# Altium footprint library Miscellaneous.PcbLib: 74 footprints (part 4 of 5)
Each footprint in its own frame and in the unit in brackets; x right, y up, seen from the top. Pads: shape width x height; smd on the part's side, far side on the other; paste and mask are expansions set on the pad; w line width, h text height; cw(c..) or ccw(c..) is an arc to the next point about the centre after c.
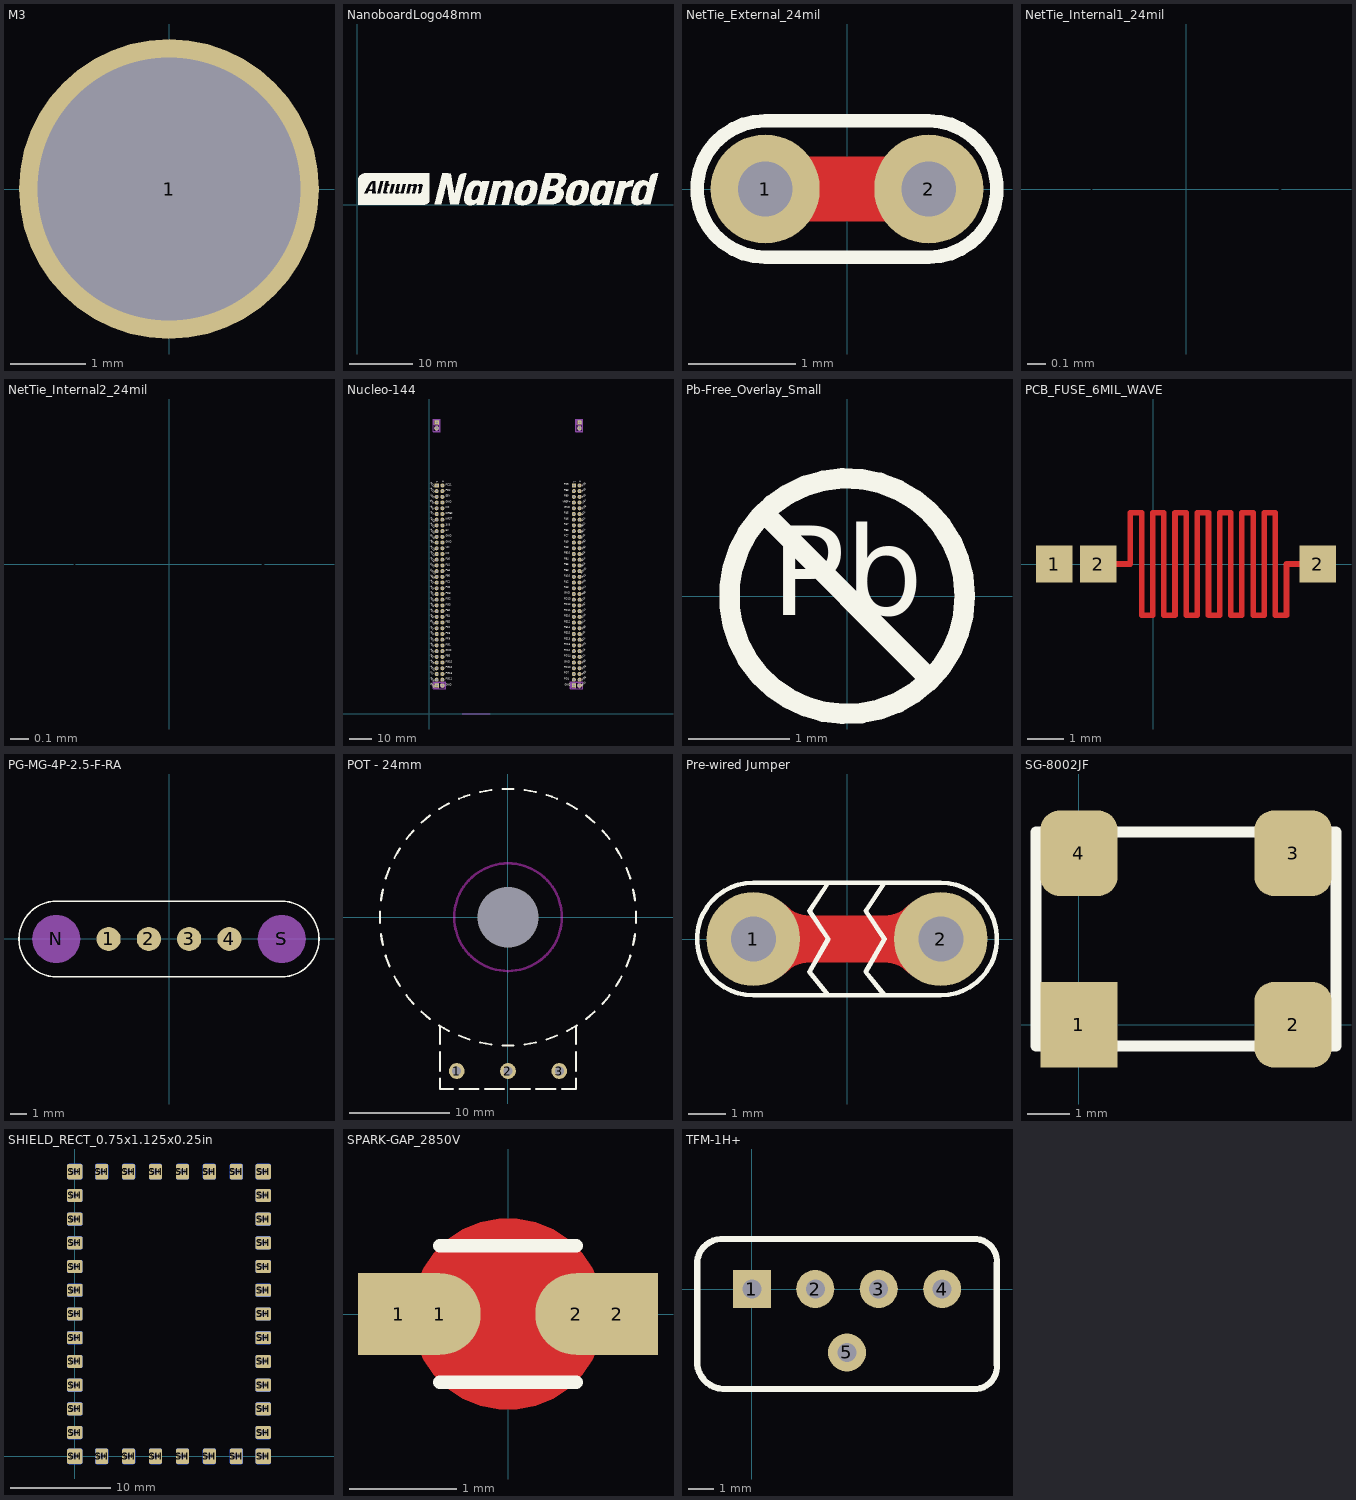
[diagram p3: the footprints below, top view; thin cyan lines are the x and y axes]

## M3 [mm]
pads (1):
  round 4 hole 3.5: 1(0,0)

## NanoboardLogo48mm [mil]
Top Overlay:
  drawing of 3446 lines, arcs and shapes, not listed

## NetTie_External_24mil [mil]
pads (2):
  round 40 hole 20: 1(-30,0) 2(30,0)
Top Layer:
  lines w24: -30,0 30,0
Top Overlay:
  lines w5: -30,-25 cw(c-30,0) -30,25 30,25 cw(c30,0) 30,-25 -30,-25
Top Solder:
  rectangle: -30,-18 30,18

## NetTie_Internal1_24mil [mil]
pads (2):
  round 24 on Mid1: 1(-20,0) 2(20,0)
Mid-Layer 1:
  lines w24: -20,0 20,0

## NetTie_Internal2_24mil [mil]
pads (2):
  round 24 on Mid2: 1(-20,0) 2(20,0)
Mid-Layer 2:
  lines w24: -20,0 20,0

## Nucleo-144 [mm]
pads (148):
  round 1.8 / inner round 1.6 / far side round 1.6 hole 1 mask+0.05: 3V3(5.842,83.82) 5V(5.842,81.28) AGND(66.802,63.5) BT0(3.302,93.98) E5V(5.842,96.52) GND(3.302,40.64) GND(3.302,78.74) GND(3.302,127) GND(5.842,12.7) GND(5.842,27.94) GND(5.842,76.2) GND(5.842,78.74) GND(5.842,93.98) GND(64.262,22.86) GND(64.262,53.34) GND(64.262,91.44) GND(66.802,12.7) GND(66.802,35.56) GND(66.802,78.74) GND(66.802,127) IOREF(5.842,88.9) NC(3.302,17.78) NC(5.842,71.12) NC(5.842,91.44) NRST(5.842,86.36) OSCI(3.302,66.04) OSCO(3.302,63.5) PA0(5.842,68.58) PA1(5.842,66.04) PA2(64.262,58.42) PA3(64.262,55.88) PA4(5.842,63.5) PA5(64.262,88.9) PA6(64.262,86.36) PA7(64.262,83.82) PA8(64.262,73.66) PA9(64.262,76.2) PA10(64.262,60.96) PA11(66.802,86.36) PA12(66.802,88.9) PA13(3.302,86.36) PA14(3.302,83.82) PA15(3.302,81.28) PB0(5.842,60.96) PB1(66.802,73.66) PB2(66.802,76.2) PB3(64.262,63.5) PB4(64.262,68.58) PB5(64.262,66.04) PB6(64.262,81.28) PB7(3.302,76.2) PB8(64.262,99.06) PB9(64.262,96.52) PB10(64.262,71.12) PB11(66.802,81.28) PB12(66.802,83.82) PB13(66.802,66.04) PB14(66.802,68.58) PB15(66.802,71.12) PC0(5.842,55.88) PC1(5.842,58.42) PC2(3.302,58.42) PC3(3.302,55.88) PC4(66.802,60.96) PC5(66.802,96.52) PC6(66.802,99.06) PC7(64.262,78.74) PC8(66.802,101.6) PC11(5.842,101.6) PC12(3.302,99.06) PC13(3.302,73.66) PC14(3.302,71.12) PC15(3.302,68.58) PD0(3.302,30.48) PD1(3.302,33.02) PD2(5.842,99.06) PD3(5.842,53.34) PD4(3.302,53.34) PD5(3.302,50.8) PD6(3.302,48.26) PD7(3.302,45.72) PD8(66.802,91.44) PD9(3.302,15.24) PD10(64.262,20.32) PD11(64.262,45.72) PD12(64.262,48.26) PD13(64.262,50.8) PD14(66.802,45.72) PD15(66.802,43.18) PE0(66.802,22.86) PE1(3.302,25.4) PE2(5.842,45.72) PE3(3.302,43.18) PE4(5.842,43.18) PE5(5.842,40.64) PE6(5.842,25.4) PE7(66.802,48.26) PE8(66.802,53.34) PE9(66.802,38.1) PE10(64.262,43.18) PE11(66.802,33.02) PE12(64.262,40.64) PE13(64.262,33.02) PE14(64.262,38.1) PE15(64.262,35.56) PF0(3.302,35.56) PF1(3.302,38.1) PF2(5.842,38.1) PF3(66.802,30.48) PF4(66.802,55.88) PF5(66.802,58.42) PF6(3.302,91.44) PF7(3.302,88.9) PF8(5.842,35.56) PF9(5.842,33.02) PF10(66.802,50.8) PF11(66.802,25.4) PF12(64.262,27.94) PF13(64.262,30.48) PF14(66.802,40.64) PF15(66.802,27.94) PG0(3.302,27.94) PG1(5.842,30.48) PG2(5.842,50.8) PG3(5.842,48.26) PG4(64.262,15.24) PG5(66.802,17.78) PG6(66.802,15.24) PG7(64.262,17.78) PG8(66.802,20.32) PG9(3.302,22.86) PG10(5.842,20.32) PG11(5.842,15.24) PG12(3.302,20.32) PG13(5.842,17.78) PG14(64.262,25.4) PG15(5.842,22.86) U5V(66.802,93.98) VBAT(3.302,60.96) VDD(3.302,96.52) VIN(5.842,73.66) VREF+(64.262,93.98)
  rect 1.85x1.85 hole 1 mask+0.05: GND(3.302,12.7)
  rect 1.85x1.85 / inner round 1.85 / far side rect 1.85x1.85 hole 1 mask+0.05: GND(3.302,129.54) GND(64.262,12.7) GND(66.802,129.54) PC9(64.262,101.6) PC10(3.302,101.6)
Top Overlay:
  text "2" at 5.266,103.664 h1.5
  text "1" at 2.741,103.389 h1.5
  text "2" at 66.226,103.639 h1.5
  text "1" at 63.701,103.364 h1.5
  text "PD3" at 7.366,52.832 h1.2
  text "NRST" at 7.366,85.852 h1.2
  text "IOREF" at 7.366,88.392 h1.2
  text "PC11" at 7.366,101.092 h1.2
  text "PB0" at 7.366,60.452 h1.2
  text "PC0" at 7.366,55.372 h1.2
  text "PC1" at 7.366,57.912 h1.2
  text "PG2" at 7.366,50.292 h1.2
  text "PE5" at 7.366,40.132 h1.2
  text "PF2" at 7.366,37.592 h1.2
  text "PG3" at 7.366,47.752 h1.2
  text "PE4" at 7.366,42.672 h1.2
  text "PG13" at 7.366,17.272 h1.2
  text "PG11" at 7.366,14.732 h1.2
  text "PE2" at 7.366,45.212 h1.2
  text "GND" at 7.366,27.432 h1.2
  text "PE6" at 7.366,24.892 h1.2
  text "PG1" at 7.366,29.972 h1.2
  text "PF9" at 7.366,32.512 h1.2
  text "PG15" at 7.366,22.352 h1.2
  text "PG10" at 7.366,19.812 h1.2
  text "PF8" at 7.366,35.052 h1.2
  text "PA4" at 7.366,62.992 h1.2
  text "PA1" at 7.366,65.532 h1.2
  text "PA0" at 7.366,68.072 h1.2
  text "NC" at 7.366,70.612 h1.2
  text "VIN" at 7.366,73.152 h1.2
  text "GND" at 7.366,75.692 h1.2
  text "GND" at 7.366,78.232 h1.2
  text "5V" at 7.366,80.772 h1.2
  text "3V3" at 7.366,83.312 h1.2
  text "NC" at 7.366,90.932 h1.2
  text "GND" at 7.366,93.472 h1.2
  text "E5V" at 7.366,96.012 h1.2
  text "PD2" at 7.366,98.552 h1.2
  text "PC15" at 0,68.834 h1.2
  text "PF7" at 0,89.154 h1.2
  text "PA13" at 0,86.614 h1.2
  text "PC10" at 0,102.108 h1.2
  text "PC12" at 0,99.568 h1.2
  text "PA14" at 0,84.074 h1.2
  text "PA15" at 0,81.534 h1.2
  text "GND" at 0,78.994 h1.2
  text "VDD" at 0,97.028 h1.2
  text "BT0" at 0,94.234 h1.2
  text "PF6" at 0,91.694 h1.2
  text "PD0" at 0,30.734 h1.2
  text "PD5" at 0,51.054 h1.2
  text "PD6" at 0,48.514 h1.2
  text "PD7" at 0,45.974 h1.2
  text "PE3" at 0,43.434 h1.2
  text "GND" at 0,40.894 h1.2
  text "OSCO" at 0,63.754 h1.2
  text "VBAT" at 0,61.214 h1.2
  text "PC2" at 0,58.674 h1.2
  text "PD4" at 0,53.594 h1.2
  text "PB7" at 0,76.454 h1.2
  text "PC13" at 0,73.914 h1.2
  text "PC14" at 0,71.374 h1.2
  text "OSCI" at 0,66.294 h1.2
  text "PF1" at 0,38.1 h1.2
  text "PF0" at 0,35.814 h1.2
  text "PD9" at 0,15.494 h1.2
  text "PG12" at 0,20.574 h1.2
  text "PG9" at 0,23.114 h1.2
  text "PE1" at 0,25.654 h1.2
  text "PD1" at 0,33.274 h1.2
  text "PC3" at 0,56.134 h1.2
  text "PG0" at 0,28.194 h1.2
  text "NC" at 0,18.034 h1.2
  text "PB8" at 60.106,98.635 h1.2
  text "PB9" at 60.106,96.095 h1.2
  text "PA6" at 60.106,85.935 h1.2
  text "PG4" at 60.106,14.815 h1.2
  text "PF12" at 60.106,27.515 h1.2
  text "PF13" at 60.106,30.055 h1.2
  text "PG7" at 60.106,17.355 h1.2
  text "GND" at 60.106,22.435 h1.2
  text "PG14" at 60.106,24.975 h1.2
  text "PE14" at 60.106,37.675 h1.2
  text "PE15" at 60.106,35.135 h1.2
  text "PE13" at 60.106,32.595 h1.2
  text "PD11" at 60.106,45.295 h1.2
  text "PE10" at 60.106,42.755 h1.2
  text "PE12" at 60.106,40.215 h1.2
  text "PD10" at 60.106,19.895 h1.2
  text "PD13" at 60.106,50.375 h1.2
  text "PD12" at 60.106,47.835 h1.2
  text "PA10" at 60.106,60.535 h1.2
  text "PA9" at 60.106,75.775 h1.2
  text "PA8" at 60.106,73.235 h1.2
  text "PB10" at 60.106,70.695 h1.2
  text "PB4" at 60.106,68.155 h1.2
  text "PB5" at 60.106,65.615 h1.2
  text "GND" at 60.106,52.915 h1.2
  text "PB3" at 60.106,63.075 h1.2
  text "PA2" at 60.106,57.995 h1.2
  text "PA3" at 60.106,55.455 h1.2
  text "PB6" at 60.106,80.855 h1.2
  text "PC7" at 60.106,78.315 h1.2
  text "PA7" at 60.106,83.395 h1.2
  text "GND" at 60.106,91.015 h1.2
  text "PA5" at 60.106,88.475 h1.2
  text "PC9" at 60.106,101.175 h1.2
  text "VREF+" at 59.411,93.548 h1.2
  text "PB12" at 68.072,82.296 h1.2
  text "PA11" at 68.072,84.836 h1.2
  text "PD8" at 68.58,90.424 h1.2
  text "U5V" at 68.58,92.964 h1.2
  text "PC5" at 68.58,95.504 h1.2
  text "PC6" at 68.58,98.044 h1.2
  text "PC8" at 68.58,100.584 h1.2
  text "PA12" at 68.072,87.376 h1.2
  text "PB1" at 68.58,72.644 h1.2
  text "PB15" at 68.072,69.596 h1.2
  text "PD14" at 68.072,44.196 h1.2
  text "PB14" at 68.072,67.056 h1.2
  text "PB13" at 68.072,64.516 h1.2
  text "AGND" at 68.072,61.976 h1.2
  text "PC4" at 68.58,59.944 h1.2
  text "PB2" at 68.58,75.184 h1.2
  text "GND" at 68.072,77.216 h1.2
  text "PB11" at 68.072,79.756 h1.2
  text "PF5" at 68.58,57.404 h1.2
  text "PF4" at 68.58,54.864 h1.2
  text "PG6" at 68.58,14.224 h1.2
  text "PF14" at 68.072,39.116 h1.2
  text "PF15" at 68.072,26.416 h1.2
  text "PF11" at 68.072,23.876 h1.2
  text "PE0" at 68.58,21.844 h1.2
  text "PG8" at 68.58,19.304 h1.2
  text "PD15" at 68.072,41.656 h1.2
  text "PE9" at 68.58,37.084 h1.2
  text "GND" at 68.072,34.036 h1.2
  text "PE11" at 68.072,31.496 h1.2
  text "PE8" at 68.58,52.324 h1.2
  text "PF10" at 68.072,49.276 h1.2
  text "PE7" at 68.58,47.244 h1.2
  text "PF3" at 68.58,29.464 h1.2
  text "PG5" at 68.58,16.764 h1.2
  text "GND" at 7.366,12.192 h1.2
  text "GND" at 60.198,12.192 h1.2
  text "GND" at 68.326,11.684 h1.2
  text "GND" at 0.009,12.954 h1.2
Bottom Overlay:
  lines w0.1: 37.369,-0.004 37.373,0 51.369,0 68,0 ; 37.369,0 2,0 cw(c2,2) 0,2 0,131.34 cw(c2,131.34) 2,133.34 68,133.34 cw(c68,131.34) 70,131.34 70,2 cw(c68,2) 68,0 ; 68,0 68,0
  lines w0.12: 2.032,13.97 7.112,13.97 ; 2.032,13.97 2.032,102.87 7.112,102.87 7.112,13.97 ; 2.032,13.97 7.112,13.97 ; 2.032,13.97 2.032,11.43 7.112,11.43 7.112,13.97 ; 62.992,13.97 62.992,102.87 68.072,102.87 68.072,13.97 ; 62.992,13.97 68.072,13.97 ; 62.992,13.97 62.992,11.43 68.072,11.43 68.072,13.97 ; 62.992,13.97 68.072,13.97 ; 2.032,125.73 4.572,125.73 4.572,130.81 2.032,130.81 2.032,125.73 ; 65.532,125.73 68.072,125.73 68.072,130.81 65.532,130.81 65.532,125.73
  lines w0.2: 36.139,0 52.589,0 52.589,11.45 36.139,11.45 36.139,0
  text "CN11" at 6.265,103.098 h1.5
  text "PF6" at 1.564,90.215 h1.2
  text "PG5" at 69.75,18.155 h1.2
  text "GND" at 5.975,10.075 h1.5
  text "GND" at 67,10.075 h1.5
  text "PG4" at 63.084,14.815 h1.2
  text "PF12" at 63.084,27.515 h1.2
  text "PF13" at 63.084,30.055 h1.2
  text "PF3" at 69.75,30.855 h1.2
  text "PF4" at 69.759,56.255 h1.2
  text "PF5" at 69.75,58.795 h1.2
  text "NC" at 1.27,17.018 h1.2
  text "PG15" at 9.535,22.435 h1.2
  text "PG0" at 1.689,26.765 h1.2
  text "PG1" at 8.784,30.055 h1.2
  text "PF0" at 1.562,34.385 h1.2
  text "PF1" at 1.449,36.925 h1.2
  text "PF2" at 8.746,37.675 h1.2
  text "PG3" at 8.933,47.835 h1.2
  text "PG2" at 8.925,50.375 h1.2
  text "NC" at 8.342,70.695 h1.2
  text "OSCI" at 2.015,64.54 h1.2
  text "PC8" at 69.75,101.975 h1.2
  text "PC6" at 69.75,99.435 h1.2
  text "PC5" at 69.75,96.895 h1.2
  text "U5V" at 69.75,94.355 h1.2
  text "PD8" at 69.75,91.815 h1.2
  text "PA11" at 69.759,86.735 h1.2
  text "PB12" at 69.759,84.195 h1.2
  text "PB11" at 69.759,81.655 h1.2
  text "GND" at 69.75,79.115 h1.2
  text "PB2" at 69.759,76.575 h1.2
  text "PC4" at 69.75,61.335 h1.2
  text "AGND" at 69.75,63.875 h1.2
  text "PB13" at 69.75,66.415 h1.2
  text "PB14" at 69.759,68.955 h1.2
  text "PB1" at 69.759,74.035 h1.2
  text "PD14" at 69.759,46.095 h1.2
  text "PE7" at 69.759,48.635 h1.2
  text "PF10" at 69.75,51.175 h1.2
  text "PE8" at 69.75,53.715 h1.2
  text "PB15" at 69.75,71.495 h1.2
  text "PE11" at 69.759,33.395 h1.2
  text "GND" at 69.75,35.935 h1.2
  text "PE9" at 69.75,38.475 h1.2
  text "PD15" at 69.75,43.555 h1.2
  text "PG6" at 69.75,15.615 h1.2
  text "PG8" at 69.75,20.695 h1.2
  text "PE0" at 69.75,23.235 h1.2
  text "PF11" at 69.759,25.775 h1.2
  text "PF15" at 69.75,28.315 h1.2
  text "PF14" at 69.759,41.015 h1.2
  text "PG7" at 63.084,17.355 h1.2
  text "PD10" at 63.084,19.895 h1.2
  text "GND" at 63.084,22.435 h1.2
  text "PG14" at 63.084,24.975 h1.2
  text "PE14" at 63.084,37.675 h1.2
  text "PE15" at 63.084,35.135 h1.2
  text "PE13" at 63.084,32.595 h1.2
  text "PD13" at 63.084,50.375 h1.2
  text "PD12" at 63.084,47.835 h1.2
  text "PD11" at 63.084,45.295 h1.2
  text "PE10" at 63.084,42.755 h1.2
  text "PE12" at 63.084,40.215 h1.2
  text "PB3" at 63.084,63.075 h1.2
  text "PA10" at 63.084,60.535 h1.2
  text "PA2" at 63.084,57.995 h1.2
  text "PA3" at 63.084,55.455 h1.2
  text "GND" at 63.084,52.915 h1.2
  text "PA9" at 63.084,75.775 h1.2
  text "PA8" at 63.084,73.235 h1.2
  text "PB10" at 63.084,70.695 h1.2
  text "PB4" at 63.084,68.155 h1.2
  text "PB5" at 63.084,65.615 h1.2
  text "PA5" at 63.084,88.475 h1.2
  text "PA6" at 63.084,85.935 h1.2
  text "PA7" at 63.084,83.395 h1.2
  text "PB6" at 63.084,80.855 h1.2
  text "PC7" at 63.084,78.315 h1.2
  text "PC9" at 63.084,101.175 h1.2
  text "PB8" at 63.084,98.635 h1.2
  text "PB9" at 63.084,96.095 h1.2
  text "GND" at 63.084,91.015 h1.2
  text "BT0" at 1.565,92.73 h1.2
  text "VDD" at 1.778,95.25 h1.2
  text "PC12" at 2.065,97.635 h1.2
  text "GND" at 1.871,77.34 h1.2
  text "PA15" at 2.032,79.78 h1.2
  text "PA14" at 2.017,82.345 h1.2
  text "PA13" at 2.028,84.885 h1.2
  text "PF7" at 1.554,87.7 h1.2
  text "PC15" at 2.074,67.055 h1.2
  text "PC14" at 2.068,69.595 h1.2
  text "PC13" at 2.07,72.16 h1.2
  text "PB7" at 1.597,74.95 h1.2
  text "PD4" at 1.636,52.09 h1.2
  text "PC3" at 1.648,54.605 h1.2
  text "PC2" at 1.642,57.12 h1.2
  text "VBAT" at 2.219,59.26 h1.2
  text "OSCO" at 2.429,61.7 h1.2
  text "GND" at 1.871,39.215 h1.2
  text "PE3" at 1.606,41.93 h1.2
  text "PD7" at 1.638,44.47 h1.2
  text "PD6" at 1.648,47.01 h1.2
  text "PD5" at 1.652,49.5 h1.2
  text "PD0" at 1.646,29.305 h1.2
  text "PD1" at 1.533,31.845 h1.2
  text "PE1" at 1.524,24.384 h1.2
  text "PG9" at 1.691,21.685 h1.2
  text "PG12" at 2.107,18.745 h1.2
  text "PD9" at 1.649,14.215 h1.2
  text "PE5" at 8.819,40.215 h1.2
  text "GND" at 9.188,27.515 h1.2
  text "PE6" at 8.814,24.975 h1.2
  text "PG10" at 9.528,19.895 h1.2
  text "PG13" at 9.53,17.355 h1.2
  text "PG11" at 9.381,14.815 h1.2
  text "PE4" at 8.811,42.755 h1.2
  text "PF8" at 8.755,35.135 h1.2
  text "PF9" at 8.755,32.595 h1.2
  text "PC1" at 8.724,57.995 h1.2
  text "PC0" at 8.871,55.455 h1.2
  text "PD3" at 8.873,52.915 h1.2
  text "VIN" at 8.614,73.235 h1.2
  text "PA0" at 8.812,68.155 h1.2
  text "PA1" at 8.665,65.615 h1.2
  text "PA4" at 8.811,63.075 h1.2
  text "PB0" at 8.812,60.535 h1.2
  text "GND" at 9.188,75.775 h1.2
  text "GND" at 9.188,78.315 h1.2
  text "5V" at 8.24,80.855 h1.2
  text "3V3" at 8.733,83.395 h1.2
  text "NRST" at 9.709,85.935 h1.2
  text "IOREF" at 9.872,88.475 h1.2
  text "GND" at 9.188,93.555 h1.2
  text "E5V" at 8.853,96.095 h1.2
  text "PD2" at 8.865,98.635 h1.2
  text "PC11" at 9.321,101.175 h1.2
  text "PA12" at 69.759,89.275 h1.2
  text "NC" at 8.342,91.015 h1.2
  text "CN12" at 65.375,103.175 h1.5
  text "PE2" at 8.806,45.295 h1.2
  text "PC10" at 2.032,100.076 h1.2
  text "VREF+" at 63.082,93.564 h1.2
  text "GND" at 0.762,126.746 h1.5
Mechanical 7:
  lines w0.01: 14.573,0.014 27.073,0.014
Mechanical 15:
  circle w0.01: c66.746,126.999 r0.925
  circle w0.01: c3.246,126.999 r0.925
  circle w0.01: c66.746,12.674 r0.925
  circle w0.01: c5.786,12.699 r0.925
  lines w0.01: 1.876,11.329 7.156,11.329 7.156,14.069 1.876,14.069 1.876,11.329 ; 1.876,125.629 4.616,125.629 4.616,130.909 1.876,130.909 1.876,125.629 ; 2.321,11.774 2.321,13.624 4.171,13.624 4.171,11.774 2.321,11.774 ; 2.321,128.614 2.321,130.464 4.171,130.464 4.171,128.614 2.321,128.614 ; 62.836,11.304 68.116,11.304 68.116,14.044 62.836,14.044 62.836,11.304 ; 63.281,11.749 63.281,13.599 65.131,13.599 65.131,11.749 63.281,11.749 ; 65.376,125.629 68.116,125.629 68.116,130.909 65.376,130.909 65.376,125.629 ; 65.821,128.614 65.821,130.464 67.671,130.464 67.671,128.614 65.821,128.614
  text "1" at 67.271,129.794 h1.5
  text "'.Designator'" at 68.875,130.8 h0.75
  text "1" at 3.771,129.794 h1.5
  text "'.Designator'" at 5.4,130.775 h0.75
  text "1" at 63.951,13.199 h1.5
  text "'.Designator'" at 67.425,13.9 h0.75
  text "1" at 2.991,13.224 h1.5
  text "'.Designator'" at 6.725,14.1 h0.75
Mechanical 17:
  lines w0.01: 1.696,11.149 7.336,11.149 7.336,14.249 1.696,14.249 1.696,11.149 ; 1.696,125.449 4.796,125.449 4.796,131.089 1.696,131.089 1.696,125.449 ; 62.656,11.124 68.296,11.124 68.296,14.224 62.656,14.224 62.656,11.124 ; 65.196,125.449 68.296,125.449 68.296,131.089 65.196,131.089 65.196,125.449
3D body "TSW-135-07-G-D.stp": height -3.12, standoff -14.04, extent 2.032,13.97 7.112,102.87
3D body "TSW-135-07-G-D.stp": height -3.12, standoff -14.04, extent 62.992,13.97 68.072,102.87
3D body "MB1364.step": height -2.94, standoff -21.51, extent 0,-4.1 70,134.458
3D body "PBD-2.stp": height 8.5, standoff -3.15, extent 2.032,125.73 4.572,130.81
3D body "PBD-2.stp": height 8.5, standoff -3.15, extent 65.532,125.73 68.072,130.81
3D body "PBD-2.stp": height 8.5, standoff -3.15, extent 62.992,59.69 68.072,62.23
3D body "PBD-2.stp": height 8.5, standoff -3.15, extent 62.992,62.23 68.072,64.77
3D body "PBD-2.stp": height 8.5, standoff -3.15, extent 62.992,57.15 68.072,59.69
3D body "PBD-2.stp": height 8.5, standoff -3.15, extent 62.992,67.31 68.072,69.85
3D body "PBD-2.stp": height 8.5, standoff -3.15, extent 62.992,69.85 68.072,72.39
3D body "PBD-2.stp": height 8.5, standoff -3.15, extent 62.992,64.77 68.072,67.31
3D body "PBD-2.stp": height 8.5, standoff -3.15, extent 62.992,74.93 68.072,77.47
3D body "PBD-2.stp": height 8.5, standoff -3.15, extent 62.992,77.47 68.072,80.01
3D body "PBD-2.stp": height 8.5, standoff -3.15, extent 62.992,72.39 68.072,74.93
3D body "PBD-2.stp": height 8.5, standoff -3.15, extent 62.992,82.55 68.072,85.09
3D body "PBD-2.stp": height 8.5, standoff -3.15, extent 62.992,85.09 68.072,87.63
3D body "PBD-2.stp": height 8.5, standoff -3.15, extent 62.992,80.01 68.072,82.55
3D body "PBD-2.stp": height 8.5, standoff -3.15, extent 62.992,90.17 68.072,92.71
3D body "PBD-2.stp": height 8.5, standoff -3.15, extent 62.992,92.71 68.072,95.25
3D body "PBD-2.stp": height 8.5, standoff -3.15, extent 62.992,87.63 68.072,90.17
3D body "PBD-2.stp": height 8.5, standoff -3.15, extent 62.992,97.79 68.072,100.33
3D body "PBD-2.stp": height 8.5, standoff -3.15, extent 62.992,100.33 68.072,102.87
3D body "PBD-2.stp": height 8.5, standoff -3.15, extent 62.992,95.25 68.072,97.79
3D body "PBD-2.stp": height 8.5, standoff -3.15, extent 62.992,13.97 68.072,16.51
3D body "PBD-2.stp": height 8.5, standoff -3.15, extent 62.992,16.51 68.072,19.05
3D body "PBD-2.stp": height 8.5, standoff -3.15, extent 62.992,11.43 68.072,13.97
3D body "PBD-2.stp": height 8.5, standoff -3.15, extent 62.992,21.59 68.072,24.13
3D body "PBD-2.stp": height 8.5, standoff -3.15, extent 62.992,24.13 68.072,26.67
3D body "PBD-2.stp": height 8.5, standoff -3.15, extent 62.992,19.05 68.072,21.59
3D body "PBD-2.stp": height 8.5, standoff -3.15, extent 62.992,29.21 68.072,31.75
3D body "PBD-2.stp": height 8.5, standoff -3.15, extent 62.992,31.75 68.072,34.29
3D body "PBD-2.stp": height 8.5, standoff -3.15, extent 62.992,26.67 68.072,29.21
3D body "PBD-2.stp": height 8.5, standoff -3.15, extent 62.992,36.83 68.072,39.37
3D body "PBD-2.stp": height 8.5, standoff -3.15, extent 62.992,39.37 68.072,41.91
3D body "PBD-2.stp": height 8.5, standoff -3.15, extent 62.992,34.29 68.072,36.83
3D body "PBD-2.stp": height 8.5, standoff -3.15, extent 62.992,44.45 68.072,46.99
3D body "PBD-2.stp": height 8.5, standoff -3.15, extent 62.992,46.99 68.072,49.53
3D body "PBD-2.stp": height 8.5, standoff -3.15, extent 62.992,41.91 68.072,44.45
3D body "PBD-2.stp": height 8.5, standoff -3.15, extent 62.992,52.07 68.072,54.61
3D body "PBD-2.stp": height 8.5, standoff -3.15, extent 62.992,54.61 68.072,57.15
3D body "PBD-2.stp": height 8.5, standoff -3.15, extent 62.992,49.53 68.072,52.07
3D body "PBD-2.stp": height 8.5, standoff -3.15, extent 2.032,59.69 7.112,62.23
3D body "PBD-2.stp": height 8.5, standoff -3.15, extent 2.032,62.23 7.112,64.77
3D body "PBD-2.stp": height 8.5, standoff -3.15, extent 2.032,57.15 7.112,59.69
3D body "PBD-2.stp": height 8.5, standoff -3.15, extent 2.032,67.31 7.112,69.85
3D body "PBD-2.stp": height 8.5, standoff -3.15, extent 2.032,69.85 7.112,72.39
3D body "PBD-2.stp": height 8.5, standoff -3.15, extent 2.032,64.77 7.112,67.31
3D body "PBD-2.stp": height 8.5, standoff -3.15, extent 2.032,74.93 7.112,77.47
3D body "PBD-2.stp": height 8.5, standoff -3.15, extent 2.032,77.47 7.112,80.01
3D body "PBD-2.stp": height 8.5, standoff -3.15, extent 2.032,72.39 7.112,74.93
3D body "PBD-2.stp": height 8.5, standoff -3.15, extent 2.032,82.55 7.112,85.09
3D body "PBD-2.stp": height 8.5, standoff -3.15, extent 2.032,85.09 7.112,87.63
3D body "PBD-2.stp": height 8.5, standoff -3.15, extent 2.032,80.01 7.112,82.55
3D body "PBD-2.stp": height 8.5, standoff -3.15, extent 2.032,90.17 7.112,92.71
3D body "PBD-2.stp": height 8.5, standoff -3.15, extent 2.032,92.71 7.112,95.25
3D body "PBD-2.stp": height 8.5, standoff -3.15, extent 2.032,87.63 7.112,90.17
3D body "PBD-2.stp": height 8.5, standoff -3.15, extent 2.032,97.79 7.112,100.33
3D body "PBD-2.stp": height 8.5, standoff -3.15, extent 2.032,100.33 7.112,102.87
3D body "PBD-2.stp": height 8.5, standoff -3.15, extent 2.032,95.25 7.112,97.79
3D body "PBD-2.stp": height 8.5, standoff -3.15, extent 2.032,13.97 7.112,16.51
3D body "PBD-2.stp": height 8.5, standoff -3.15, extent 2.032,16.51 7.112,19.05
3D body "PBD-2.stp": height 8.5, standoff -3.15, extent 2.032,11.43 7.112,13.97
3D body "PBD-2.stp": height 8.5, standoff -3.15, extent 2.032,21.59 7.112,24.13
3D body "PBD-2.stp": height 8.5, standoff -3.15, extent 2.032,24.13 7.112,26.67
3D body "PBD-2.stp": height 8.5, standoff -3.15, extent 2.032,19.05 7.112,21.59
3D body "PBD-2.stp": height 8.5, standoff -3.15, extent 2.032,29.21 7.112,31.75
3D body "PBD-2.stp": height 8.5, standoff -3.15, extent 2.032,31.75 7.112,34.29
3D body "PBD-2.stp": height 8.5, standoff -3.15, extent 2.032,26.67 7.112,29.21
3D body "PBD-2.stp": height 8.5, standoff -3.15, extent 2.032,36.83 7.112,39.37
3D body "PBD-2.stp": height 8.5, standoff -3.15, extent 2.032,39.37 7.112,41.91
3D body "PBD-2.stp": height 8.5, standoff -3.15, extent 2.032,34.29 7.112,36.83
3D body "PBD-2.stp": height 8.5, standoff -3.15, extent 2.032,44.45 7.112,46.99
3D body "PBD-2.stp": height 8.5, standoff -3.15, extent 2.032,46.99 7.112,49.53
3D body "PBD-2.stp": height 8.5, standoff -3.15, extent 2.032,41.91 7.112,44.45
3D body "PBD-2.stp": height 8.5, standoff -3.15, extent 2.032,52.07 7.112,54.61
3D body "PBD-2.stp": height 8.5, standoff -3.15, extent 2.032,54.61 7.112,57.15
3D body "PBD-2.stp": height 8.5, standoff -3.15, extent 2.032,49.53 7.112,52.07

## Pb-Free_Overlay_Small [mil]
height 161.42
Top Overlay:
  circle w8: c0,0 r46
  lines w8: -32.53,32.53 32.53,-32.53
  text "Pb" at -29.6,-18.9 h60

## PCB_FUSE_6MIL_WAVE [mm] "PCB Fuse, 6 mils wide, fuse time depends on substrate and current"
pads (3):
  rrect1% 1x1 smd paste-2: 1(-2.7,0) 2(-1.5,0) 2(4.5,0)
Top Layer:
  lines w0.152: -1,0 -0.619,0 -0.619,1.4 -0.314,1.4 -0.314,-1.4 -0.01,-1.4 -0.01,1.4 0.295,1.4 0.295,-1.4 0.6,-1.4 0.6,1.4 0.905,1.4 0.905,-1.4 1.21,-1.4 1.21,1.4 1.514,1.4 1.514,-1.4 1.819,-1.4 1.819,1.4 2.124,1.4 2.124,-1.4 2.429,-1.4 2.429,1.4 2.734,1.4 2.734,-1.4 3.038,-1.4 3.038,1.4 3.343,1.4 3.343,-1.4 3.648,-1.4 3.648,0 4,0
3D body: height 0.05, standoff 0, extent -3.2,-0.5 5,0.5

## PG-MG-4P-2.5-F-RA [mm]
pads (6):
  round 1.5 smd: 1(-3.75,0) 2(-1.25,0) 3(1.25,0) 4(3.75,0)
  round 3 on Mech15: N(-7,0) S(7,0)
Top Overlay:
  lines w0.1: -6.955,-2.355 cw(c-6.955,0) -6.955,2.355 6.955,2.355 cw(c6.955,0) 6.955,-2.355 -6.955,-2.355

## POT - 24mm [mil]
pads (4):
  round 62 hole 35: 1(-200,-600) 2(0,-600) 3(200,-600)
  round 50 hole 236.22 unplated: MNT(0,0)
Top Overlay:
  lines w8: -499.52,-21.81 cw(c0,0) -499.52,21.81 ; -495.72,-65.26 ccw(c0,0) -488.15,-108.22 ; -495.72,65.26 cw(c0,0) -488.15,108.22 ; -476.86,-150.35 ccw(c0,0) -461.94,-191.34 ; -476.86,150.35 cw(c0,0) -461.94,191.34 ; -443.51,-230.87 ccw(c0,0) -421.7,-268.65 ; -443.51,230.87 cw(c0,0) -421.7,268.65 ; -396.68,-304.38 ccw(c0,0) -368.64,-337.8 ; -396.68,304.38 cw(c0,0) -368.64,337.8 ; -337.8,-368.64 ccw(c0,0) -304.38,-396.68 ; -337.8,368.64 cw(c0,0) -304.38,396.68 ; -268.65,-421.7 ccw(c0,0) -230.87,-443.51 ; -268.65,421.7 cw(c0,0) -230.87,443.51 ; -265,-630 -265,-670 -215,-670 ; -265,-600 -265,-525 ; -265,-495 -265,-425 ; -191.34,-461.94 ccw(c0,0) -150.35,-476.86 ; -191.34,461.94 cw(c0,0) -150.35,476.86 ; -190,-670 -115,-670 ; -108.22,-488.15 ccw(c0,0) -65.26,-495.72 ; -108.22,488.15 cw(c0,0) -65.26,495.72 ; -90,-670 -15,-670 ; -21.81,-499.52 ccw(c0,0) 21.81,-499.52 ; -21.81,499.52 cw(c0,0) 21.81,499.52 ; 10,-670 85,-670 ; 65.26,-495.72 ccw(c0,0) 108.22,-488.15 ; 65.26,495.72 cw(c0,0) 108.22,488.15 ; 110,-670 185,-670 ; 150.35,-476.86 ccw(c0,0) 191.34,-461.94 ; 150.35,476.86 cw(c0,0) 191.34,461.94 ; 210,-670 265,-670 265,-630 ; 230.87,-443.51 ccw(c0,0) 268.65,-421.7 ; 230.87,443.51 cw(c0,0) 268.65,421.7 ; 265,-600 265,-525 ; 265,-495 265,-425 ; 304.38,-396.68 ccw(c0,0) 337.8,-368.64 ; 304.38,396.68 cw(c0,0) 337.8,368.64 ; 368.64,-337.8 ccw(c0,0) 396.68,-304.38 ; 368.64,337.8 cw(c0,0) 396.68,304.38 ; 421.7,-268.65 ccw(c0,0) 443.51,-230.87 ; 421.7,268.65 cw(c0,0) 443.51,230.87 ; 461.94,-191.34 ccw(c0,0) 476.86,-150.35 ; 461.94,191.34 cw(c0,0) 476.86,150.35 ; 488.15,-108.22 ccw(c0,0) 495.72,-65.26 ; 488.15,108.22 cw(c0,0) 495.72,65.26 ; 499.52,-21.81 ccw(c0,0) 499.52,21.81
Keep-Out Layer:
  circle w10: c0,0 r210

## Pre-wired Jumper [mil]
pads (2):
  round 100 hole 48: 1(-100,0) 2(100,0)
Top Layer:
  lines w50: -100,0 100,0 ; -82.32,-17.68 cw(c-39.64,-60.36) -39.64,0 cw(c-39.64,60.36) -82.32,17.68 ; 82.32,-17.68 ccw(c39.64,-60.36) 39.64,0 ccw(c39.64,60.36) 82.32,17.68
Top Overlay:
  lines w5: -20,-60 -40,-35 -20,0 -40,30 -20,60 ; 40,-60 20,-35 40,0 20,30 40,60 ; -100,-60 cw(c-100,0) -100,60 100,60 cw(c100,0) 100,-60 -100,-60

## SG-8002JF [mm] "SOJ 4pin 7.1x5.1x1.5 mm"
height 1.5
pads (4):
  rect 1.8x2 smd: 1(0,0)
  rrect50% 1.8x2 smd: 2(5,0) 3(5,4) 4(0,4)
Top Overlay:
  lines w0.254: -1,-0.5 -1,4.5 6,4.5 6,-0.5 -1,-0.5
3D body "User Library-VX3-Quartz-Oscillator.step": height 1.6, standoff 0, extent -1,-0.5 6,4.5

## SHIELD_RECT_0.75x1.125x0.25in [mil] "Fotofab standard RF shield, 1.125\"x0.75\", 0.25\" tall"
height 250
pads (114):
  round 40 hole 20: SH(0,0) SH(0,92.5) SH(0,185) SH(0,277.5) SH(0,370) SH(0,462.5) SH(0,555) SH(0,647.5) SH(0,740) SH(0,832.5) SH(0,925) SH(0,1017.5) SH(0,1110) SH(105,0) SH(105,1110) SH(210,0) SH(210,1110) SH(315,0) SH(315,1110) SH(420,0) SH(420,1110) SH(525,0) SH(525,1110) SH(630,0) SH(630,1110) SH(735,0) SH(735,92.5) SH(735,185) SH(735,277.5) SH(735,370) SH(735,462.5) SH(735,555) SH(735,647.5) SH(735,740) SH(735,832.5) SH(735,925) SH(735,1017.5) SH(735,1110)
  rrect25% 60x60 smd: SH(0,0) SH(0,1110) SH(735,0) SH(735,1110)
  rrect25% 60x60 smd far side: SH(0,0) SH(0,1110) SH(735,0) SH(735,1110)
  rrect25% 60x50 smd: SH(0,92.5) SH(0,185) SH(0,277.5) SH(0,370) SH(0,462.5) SH(0,555) SH(0,647.5) SH(0,740) SH(0,832.5) SH(0,925) SH(0,1017.5) SH(735,92.5) SH(735,185) SH(735,277.5) SH(735,370) SH(735,462.5) SH(735,555) SH(735,647.5) SH(735,740) SH(735,832.5) SH(735,925) SH(735,1017.5)
  rrect25% 60x50 smd far side: SH(0,92.5) SH(0,185) SH(0,277.5) SH(0,370) SH(0,462.5) SH(0,555) SH(0,647.5) SH(0,740) SH(0,832.5) SH(0,925) SH(0,1017.5) SH(735,92.5) SH(735,185) SH(735,277.5) SH(735,370) SH(735,462.5) SH(735,555) SH(735,647.5) SH(735,740) SH(735,832.5) SH(735,925) SH(735,1017.5)
  rrect25% 50x60 smd: SH(105,0) SH(105,1110) SH(210,0) SH(210,1110) SH(315,0) SH(315,1110) SH(420,0) SH(420,1110) SH(525,0) SH(525,1110) SH(630,0) SH(630,1110)
  rrect25% 50x60 smd far side: SH(105,0) SH(105,1110) SH(210,0) SH(210,1110) SH(315,0) SH(315,1110) SH(420,0) SH(420,1110) SH(525,0) SH(525,1110) SH(630,0) SH(630,1110)
3D body "Shield box 0.75x1.125x0.25 inch.stp": height 250, standoff 0, extent -7.49,-7.49 742.51,1117.5

## SP-2004Y [mil]
3D body "SP-2004Y.stp": height 175.2, standoff 19.68, extent -393.69,-393.69 393.71,393.71

## SPARK-GAP_2850V [mil] "Spark gap, voltage approx 2850 per (3000 pd + 1350)"
pads (4):
  rrect1% 30x30 smd paste-20 mask-20: 1(-40,0) 2(40,0)
  round 30 smd paste-20 mask+5: 1(-25,0) 2(25,0)
Top Layer:
  pour cut-out: 0,35 3.45,35 10.21,33.65 16.58,31.02 22.31,27.19 27.19,22.31 31.02,16.58 33.65,10.21 35,3.45 35,0 35,-3.45 33.65,-10.21 31.02,-16.58 27.19,-22.31 22.31,-27.19 16.58,-31.02 10.21,-33.65 3.45,-35 0,-35 -3.45,-35 -10.21,-33.65 -16.58,-31.02 -22.31,-27.19 -27.19,-22.31 -31.02,-16.58 -33.65,-10.21 -35,-3.45 -35,0 -35,3.45 -33.65,10.21 -31.02,16.58 -27.19,22.31 -22.31,27.19 -16.58,31.02 -10.21,33.65 -3.45,35
Top Overlay:
  lines w5: -25,-25 25,-25 ; -25,25 25,25
Top Solder:
  rectangle: -25,-20 25,20

## TFM-1H+ [mil] "Frequency Mixer"
height 196.85
pads (5):
  rect 60x60 hole 30: 1(0,0)
  round 60 hole 30: 2(100,0) 3(200,0) 4(300,0) 5(150,-100)
Top Overlay:
  lines w10: -86.22,-118.11 ccw(c-43.11,-114.37) -39.37,-157.48 354.33,-157.48 ccw(c350.59,-121.85) 386.22,-118.11 386.22,39.37 ccw(c350.59,43.11) 354.33,78.74 -43.11,78.74 ccw(c-46.85,39.37) -86.22,43.11 -86.22,-118.11